# Altium footprint library my_pcb_lib.PcbLib: 26 footprints (part 1 of 2)
Each footprint in its own frame and in the unit in brackets; x right, y up, seen from the top. Pads: shape width x height; smd on the part's side, far side on the other; paste and mask are expansions set on the pad; w line width, h text height; cw(c..) or ccw(c..) is an arc to the next point about the centre after c.
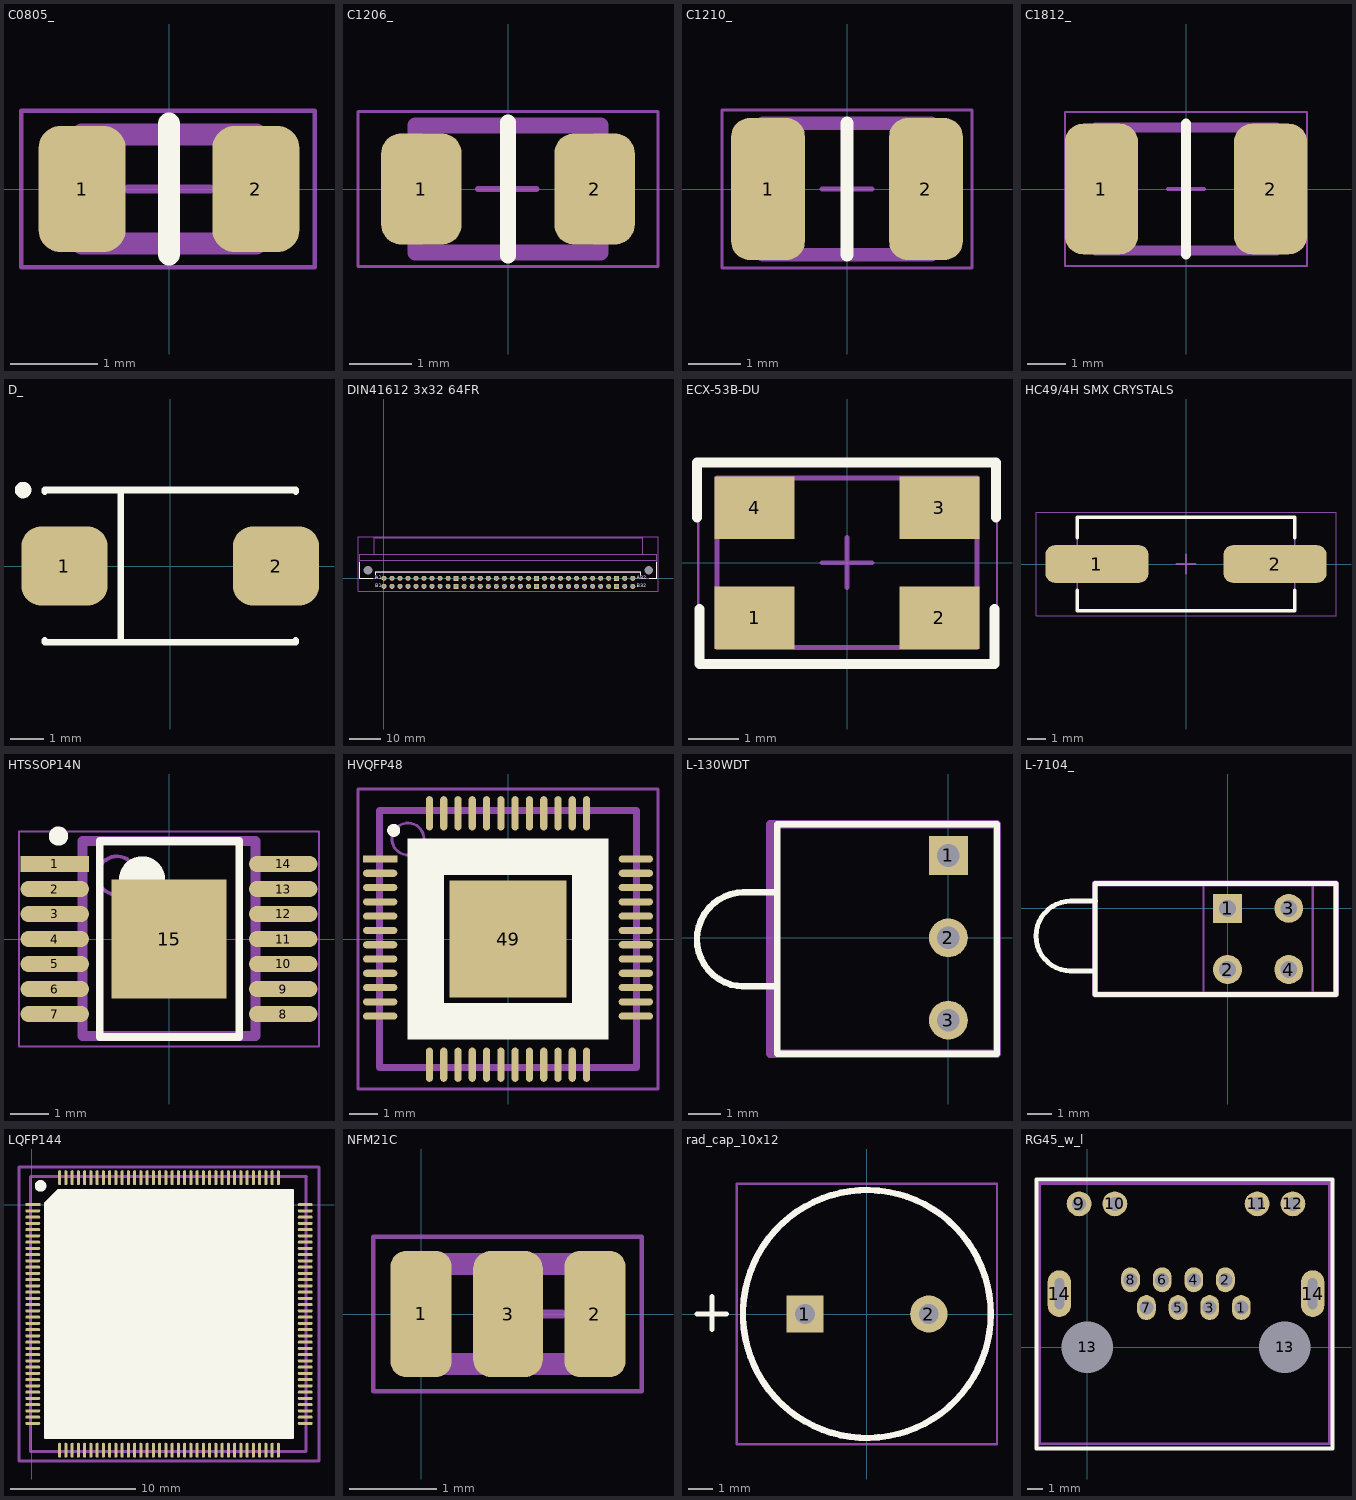
[diagram p0: the footprints below, top view; thin cyan lines are the x and y axes]

## C0805_ [mm]
height 0.025
pads (2):
  rrect50% 1x1.45 smd: 1(-1,0) 2(1,0)
Top Overlay:
  lines w0.254: 0,-0.75 0,0.75
Mechanical 3:
  lines w0.254: -1,-0.625 -1,0.625 1,0.625 1,-0.625 -1,-0.625
Mechanical 13:
  lines w0.1: -1,-0.625 1,-0.625 1,0.625 -1,0.625 -1,-0.625
Mechanical 15:
  lines w0.05: -1.7,-0.9 -1.7,0.9 1.675,0.9 1.675,-0.9 -1.7,-0.9
  lines w0.1: -0.475,0 0.475,0 ; 0,-0.475 0,0.475
3D body "SW3dPS-0805 SMD Capacitor.STEP": height 0.78, standoff 0, extent -1,-0.625 1,0.625

## C1206_ [mm]
height 2
pads (2):
  rrect50% 1.3x1.8 smd: 1(-1.4,0) 2(1.4,0)
Top Overlay:
  lines w0.254: 0,-1.075 0,1.075
Mechanical 3:
  lines w0.254: -1.5,-1.025 1.5,-1.025 1.5,1.025 -1.5,1.025 -1.5,-1.025
Mechanical 13:
  lines w0.1: -1.525,-1.025 1.5,-1.025 1.5,1.025 -1.525,1.025 -1.525,-1.025
Mechanical 15:
  lines w0.05: -2.425,-1.25 2.425,-1.25 2.425,1.25 -2.425,1.25 -2.425,-1.25
  lines w0.1: -0.488,0 0.462,0 ; -0.013,-0.475 -0.013,0.475
3D body "SW3dPS-1206 SMD Capacitor.STEP": height 1, standoff 0, extent -1.6,-0.8 1.6,0.8

## C1210_ [mm]
pads (2):
  rrect50% 1.4x2.7 smd: 1(-1.5,0) 2(1.5,0)
Top Overlay:
  lines w0.254: 0,-1.25 0,1.25
Mechanical 3:
  lines w0.254: -1.6,-1.25 -1.6,1.25 1.6,1.25 1.6,-1.25 -1.6,-1.25
Mechanical 13:
  lines w0.1: -1.6,-1.25 1.6,-1.25 1.6,1.25 -1.6,1.25 -1.6,-1.25
Mechanical 15:
  lines w0.05: -2.375,-1.5 -2.375,1.5 2.375,1.5 2.375,-1.5 -2.375,-1.5
  lines w0.1: -0.475,0 0.475,0 ; 0,-0.475 0,0.475
3D body "c1210c105k1ractu.stp": height 1.94, standoff 0.04, extent -1.651,-1.35 1.749,1.35

## C1812_ [mm]
pads (2):
  rrect50% 1.9x3.4 smd: 1(-2.2,0) 2(2.2,0)
Top Overlay:
  lines w0.254: 0,-1.7 0,1.7
Mechanical 3:
  lines w0.254: -2.35,-1.6 -2.35,1.6 2.35,1.6 2.35,-1.6 -2.35,-1.6
Mechanical 13:
  lines w0.1: -2.35,-1.6 -2.35,1.6 2.35,1.6 2.35,-1.6 -2.35,-1.6
Mechanical 15:
  lines w0.05: -3.15,-2 3.15,-2 3.15,2 -3.15,2 -3.15,-2
  lines w0.1: -0.475,0 0.475,0 ; 0,-0.475 0,0.475
3D body "70611065.stp": height 1.84, standoff 0.04, extent -2.45,-1.778 2.45,1.722

## D_ [mm] "Capacitor, SM Tantalum; Body 7.3 x 4.3 mm (LxW typ)"
height 3.1
pads (2):
  rrect50% 2.6x2.4 smd: 1(-3.2,0) 2(3.2,0)
Top Overlay:
  circle w0.25: c-4.45,2.3 r0.125
  lines w0.2: -3.8,-2.25 -3.8,-2.3 3.8,-2.3 3.8,-2.25 ; -3.8,2.25 -3.8,2.3 3.8,2.3 3.8,2.25 ; -1.5,-2.3 -1.5,2.3
3D body "User Library-CaseD_7343-31.STEP": height 2.8, standoff 0, extent -3.65,-2.15 3.65,2.15

## DIN41612 3x32 64FR [mm] "96-Pin DIN Standard Right Angle Male PCB Mount Connector Розетка"
height 9.5
pads (66):
  round 0 hole 2.8 unplated mask+1.5: 0(-5.08,2.54) 0(83.82,2.54)
  round 1.6 hole 1: A1(0,0) A2(2.54,0) A3(5.08,0) A4(7.62,0) A5(10.16,0) A6(12.7,0) A7(15.24,0) A8(17.78,0) A9(20.32,0) A11(25.4,0) A12(27.94,0) A13(30.48,0) A14(33.02,0) A15(35.56,0) A16(38.1,0) A17(40.64,0) A18(43.18,0) A19(45.72,0) A21(50.8,0) A22(53.34,0) A23(55.88,0) A24(58.42,0) A25(60.96,0) A26(63.5,0) A27(66.04,0) A28(68.58,0) A29(71.12,0) A31(76.2,0) A32(78.74,0) B1(0,-2.54) B2(2.54,-2.54) B3(5.08,-2.54) B4(7.62,-2.54) B5(10.16,-2.54) B6(12.7,-2.54) B7(15.24,-2.54) B8(17.78,-2.54) B9(20.32,-2.54) B11(25.4,-2.54) B12(27.94,-2.54) B13(30.48,-2.54) B14(33.02,-2.54) B15(35.56,-2.54) B16(38.1,-2.54) B17(40.64,-2.54) B18(43.18,-2.54) B19(45.72,-2.54) B21(50.8,-2.54) B22(53.34,-2.54) B23(55.88,-2.54) B24(58.42,-2.54) B25(60.96,-2.54) B26(63.5,-2.54) B27(66.04,-2.54) B28(68.58,-2.54) B29(71.12,-2.54) B31(76.2,-2.54) B32(78.74,-2.54)
  rect 1.6x1.6 hole 1: A10(22.86,0) A20(48.26,0) A30(73.66,0) B10(22.86,-2.54) B20(48.26,-2.54) B30(73.66,-2.54)
Top Overlay:
  lines w0.2: -7.62,5 -7.62,0 -3.6,0 ; -2.54,1.06 -2.54,2 81.28,2 81.28,0.92 ; 84,0 86.36,0 86.36,5
  text "A1" at -2.8,-0.75 h2
  text "B1" at -2.8,-3.3 h2
  text "A32" at 80,-0.75 h2
  text "B32" at 80,-3.3 h2
Bottom Overlay:
  lines w0.2: -7.62,5 -7.62,0 -2.54,0 -2.54,-4.061 81.28,-4.061 81.28,0 86.36,0 86.36,5
Mechanical 3:
  lines w0.254: -7.625,0 -2.525,0 ; -7.62,0.025 -7.62,7.525 ; -7.62,5.7 86.36,5.7 ; -7.605,7.55 -3.125,7.55 ; -3.125,7.575 -3.125,12.75 81.85,12.75 81.85,7.55 86.36,7.55 ; -2.555,1.975 81.25,1.975 ; -2.55,0 -2.55,1.975 ; 81.275,0 81.275,1.95 ; 81.3,0 86.3,0 ; 86.36,0 86.36,7.505
Mechanical 13:
  lines w0.2: -7.62,5.7 86.36,5.7 ; -7.62,7.54 -7.62,0 -2.54,0 -2.54,2 81.28,2 81.28,0 86.36,0 86.36,7.54 81.85,7.54 ; -7.6,7.54 -3.125,7.54 ; -3.125,7.54 81.85,7.54 ; -3.125,7.54 -3.125,12.75 81.85,12.75 81.85,7.54
Mechanical 15:
  lines w0.05: -8.2,-4.028 86.725,-4.028 86.725,13.1 -8.2,13.1 -8.2,-4.028
  lines w0.1: -0.5,0.025 0.5,0.025 ; 0,-0.5 0,0.5
3D body "din_41612_male_b-64abr.stp": height 7.4, standoff -2.9, extent -7.484,-2.845 86.516,12.725

## ECX-53B-DU [mm] "SMX crystals"
height 4.3
pads (4):
  rect 1.6x1.25 smd: 1(-1.85,-1.1) 2(1.85,-1.1) 3(1.85,1.1) 4(-1.85,1.1)
Top Overlay:
  lines w0.2: -3,0.9 -3,2 2.975,2 2.975,0.9 ; -2.95,-0.925 -2.95,-2.025 2.95,-2.025 2.95,-0.925
Mechanical 13:
  lines w0.1: -2.6,-1.7 2.6,-1.7 2.6,1.7 -2.6,1.7 -2.6,-1.7
Mechanical 15:
  lines w0.05: -2.975,-2.05 3,-2.05 3,2 -2.975,2 -2.975,-2.05
  lines w0.1: -0.5,0 0.5,0 ; 0,-0.5 0,0.5
3D body "User Library-XTAL_ecx-53b.step": height 0.85, standoff 0, extent -2.5,-1.6 2.5,1.6

## HC49/4H SMX CRYSTALS [mm] "SMX crystals"
height 4.3
pads (2):
  rrect50% 5.5x2 smd: 1(-4.75,0) 2(4.75,0)
Top Overlay:
  lines w0.2: -5.8,-1.4 -5.8,-2.5 5.8,-2.5 5.8,-1.4 ; -5.8,1.4 -5.8,2.5 5.8,2.5 5.8,1.4
Mechanical 13:
  lines w0.1: -5.8,-2.45 -5.8,2.45 5.8,2.45 5.8,-2.45 -5.8,-2.45
Mechanical 15:
  lines w0.05: -8,-2.75 -8,2.75 8,2.75 8,-2.75 -8,-2.75
  lines w0.1: -0.5,0 0.5,0 ; 0,-0.5 0,0.5
3D body: height 4.3, standoff 0, extent -5.8,-2.45 5.8,2.45

## HTSSOP14N [mm] "TSSOP, 14-Leads, Body 5,00x4,40mm, Pitch 0,65mm, IPC Medium Density"
height 1.05
pads (15):
  rect 1.78x0.42 smd: 1(-2.97,1.95)
  oval 1.78x0.42 smd: 2(-2.97,1.3) 3(-2.97,0.65) 4(-2.97,0) 5(-2.97,-0.65) 6(-2.97,-1.3) 7(-2.97,-1.95) 8(2.97,-1.95) 9(2.97,-1.3) 10(2.97,-0.65) 11(2.97,0) 12(2.97,0.65) 13(2.97,1.3) 14(2.97,1.95)
  rect 3x3.1 smd: 15(0,0)
Top Overlay:
  circle w0.25: c-2.875,2.675 r0.125
  circle w0.6: c-0.7,1.55 r0.3
  lines w0.2: -1.8,-2.55 -1.8,2.55 1.825,2.55 1.825,-2.55 -1.8,-2.55
Mechanical 3:
  lines w0.254: -2.25,-2.525 -2.25,2.55 2.25,2.55 2.25,-2.525 -2.25,-2.525
Mechanical 13:
  circle w0.1: c-1.35,1.65 r0.5
  lines w0.1: -2.25,-2.55 -2.25,2.55 2.25,2.55 2.25,-2.55 -2.25,-2.55
Mechanical 15:
  lines w0.05: -3.9,-2.8 -3.9,2.8 3.9,2.8 3.9,-2.8 -3.9,-2.8
  lines w0.1: -0.5,0 0.5,0 ; 0,-0.5 0,0.5
3D body "User Library-HTSSOP14.STEP": height 1.1, standoff 0, extent -3.191,-2.491 3.191,2.491

## HVQFP48 [mm]
pads (49):
  rect 1.2x0.25 smd: 1(-4.475,2.8)
  oval 1.2x0.25 smd: 2(-4.475,2.3) 3(-4.475,1.8) 4(-4.475,1.3) 5(-4.475,0.8) 6(-4.475,0.3) 7(-4.475,-0.2) 8(-4.475,-0.7) 9(-4.475,-1.2) 10(-4.475,-1.7) 11(-4.475,-2.2) 12(-4.475,-2.7) 25(4.475,-2.7) 26(4.475,-2.2) 27(4.475,-1.7) 28(4.475,-1.2) 29(4.475,-0.7) 30(4.475,-0.2) 31(4.475,0.3) 32(4.475,0.8) 33(4.475,1.3) 34(4.475,1.8) 35(4.475,2.3) 36(4.475,2.8)
  oval 0.25x1.2 smd: 13(-2.75,-4.4) 14(-2.25,-4.4) 15(-1.75,-4.4) 16(-1.25,-4.4) 17(-0.75,-4.4) 18(-0.25,-4.4) 19(0.25,-4.4) 20(0.75,-4.4) 21(1.25,-4.4) 22(1.75,-4.4) 23(2.25,-4.4) 24(2.75,-4.4) 37(2.75,4.4) 38(2.25,4.4) 39(1.75,4.4) 40(1.25,4.4) 41(0.75,4.4) 42(0.25,4.4) 43(-0.25,4.4) 44(-0.75,4.4) 45(-1.25,4.4) 46(-1.75,4.4) 47(-2.25,4.4) 48(-2.75,4.4)
  rect 4.1x4.1 smd: 49(0,0)
Top Overlay:
  region: -3.5,3.5 3.5,3.5 3.5,-3.5 -3.5,-3.5 -3.5,3.5 -2.25,2.25 -2.25,-2.25 2.25,-2.25 2.25,2.25 -2.25,2.25
  lines w0.254: -3.905,3.768 cw(c-4,3.8) -3.9,3.8
Mechanical 11:
  lines w0.254: -4.5,-4.5 -4.5,4.5 4.5,4.5 4.5,-4.5 -4.5,-4.5
Mechanical 13:
  circle w0.1: c-3.5,3.5 r0.559
  lines w0.1: -4.5,-4.461 4.5,-4.461 4.5,4.539 -4.5,4.539 -4.5,-4.461
Mechanical 15:
  lines w0.1: -5.25,-5.25 -5.25,5.25 5.25,5.25 5.25,-5.25 -5.25,-5.25
3D body "User Library-Assem10.step": height 1.56, standoff 0, extent -4.5,-4.461 4.5,4.539

## L-130WDT [mm]
pads (3):
  rect 1.2x1.2 hole 0.7: 1(0,2.54)
  round 1.2 hole 0.7: 2(0,0) 3(0,-2.54)
Top Overlay:
  lines w0.2: -6.35,-1.5 -5.3,-1.5 ; -6.325,1.4 -5.275,1.4 ; -6.3,-1.5 cw(c-6.3,-0.05) -6.3,1.4 ; -5.275,-3.57 1.5,-3.57 1.5,3.5 -5.275,3.5 -5.275,-3.57
Mechanical 3:
  lines w0.254: -5.5,-3.575 1.5,-3.575 1.5,3.5 -5.5,3.5 -5.5,-3.575
Mechanical 13:
  lines w0.1: -5.275,-3.57 -5.275,3.425 1.5,3.425 1.5,-3.57 -5.275,-3.57
Mechanical 15:
  lines w0.1: -0.4,0 0.4,0 ; 0,-0.4 0,0.4 ; -5.425,-3.57 1.5,-3.57 1.5,3.5 -5.425,3.5 -5.425,-3.57
3D body: height 3.86, standoff 0.97, extent -7.78,-1.447 -5.08,1.447
3D body: height 5, standoff 0, extent -5.08,-3.5 1.27,3.5

## L-7104_ [mm]
pads (4):
  rect 1.2x1.2 hole 0.7: 1(0,0)
  round 1.2 hole 0.7: 2(0,-2.54) 3(2.54,0) 4(2.54,-2.54)
Top Overlay:
  lines w0.2: -6.55,-2.6 -5.5,-2.6 ; -6.525,0.3 -5.475,0.3 ; -6.5,-2.6 cw(c-6.5,-1.15) -6.5,0.3 ; -5.5,-3.57 4.5,-3.57 4.5,1.03 -5.5,1.03 -5.5,-3.57
Mechanical 3:
  lines w0.254: -5.5,-3.575 4.5,-3.575 4.5,1.025 -5.5,1.025 -5.5,-3.575
Mechanical 13:
  lines w0.1: -5.5,-3.57 -5.5,1.03 4.5,1.03 4.5,-3.57 -5.5,-3.57
Mechanical 15:
  lines w0.1: -0.4,0 0.4,0 ; 0,-0.4 0,0.4 ; -1,-3.57 3.54,-3.57 3.54,1.03 -1,1.03 -1,-3.57
3D body "User Library-L-7104MD-2GD.step": height 9.65, standoff -3.68, extent -7.23,-3.45 3.7,0.85

## LQFP144 [mm]
pads (144):
  rect 1.2x0.25 smd: 1(0.1,0)
  oval 1.2x0.25 smd: 2(0.1,-0.5) 3(0.1,-1) 4(0.1,-1.5) 5(0.1,-2) 6(0.1,-2.5) 7(0.1,-3) 8(0.1,-3.5) 9(0.1,-4) 10(0.1,-4.5) 11(0.1,-5) 12(0.1,-5.5) 13(0.1,-6) 14(0.1,-6.5) 15(0.1,-7) 16(0.1,-7.5) 17(0.1,-8) 18(0.1,-8.5) 19(0.1,-9) 20(0.1,-9.5) 21(0.1,-10) 22(0.1,-10.5) 23(0.1,-11) 24(0.1,-11.5) 25(0.1,-12) 26(0.1,-12.5) 27(0.1,-13) 28(0.1,-13.5) 29(0.1,-14) 30(0.1,-14.5) 31(0.1,-15) 32(0.1,-15.5) 33(0.1,-16) 34(0.1,-16.5) 35(0.1,-17) 36(0.1,-17.5) 73(21.9,-17.5) 74(21.9,-17) 75(21.9,-16.5) 76(21.9,-16) 77(21.9,-15.5) 78(21.9,-15) 79(21.9,-14.5) 80(21.9,-14) 81(21.9,-13.5) 82(21.9,-13) 83(21.9,-12.5) 84(21.9,-12) 85(21.9,-11.5) 86(21.9,-11) 87(21.9,-10.5) 88(21.9,-10) 89(21.9,-9.5) 90(21.9,-9) 91(21.9,-8.5) 92(21.9,-8) 93(21.9,-7.5) 94(21.9,-7) 95(21.9,-6.5) 96(21.9,-6) 97(21.9,-5.5) 98(21.9,-5) 99(21.9,-4.5) 100(21.9,-4) 101(21.9,-3.5) 102(21.9,-3) 103(21.9,-2.5) 104(21.9,-2) 105(21.9,-1.5) 106(21.9,-1) 107(21.9,-0.5) 108(21.9,0)
  oval 0.25x1.2 smd: 37(2.25,-19.65) 38(2.75,-19.65) 39(3.25,-19.65) 40(3.75,-19.65) 41(4.25,-19.65) 42(4.75,-19.65) 43(5.25,-19.65) 44(5.75,-19.65) 45(6.25,-19.65) 46(6.75,-19.65) 47(7.25,-19.65) 48(7.75,-19.65) 49(8.25,-19.65) 50(8.75,-19.65) 51(9.25,-19.65) 52(9.75,-19.65) 53(10.25,-19.65) 54(10.75,-19.65) 55(11.25,-19.65) 56(11.75,-19.65) 57(12.25,-19.65) 58(12.75,-19.65) 59(13.25,-19.65) 60(13.75,-19.65) 61(14.25,-19.65) 62(14.75,-19.65) 63(15.25,-19.65) 64(15.75,-19.65) 65(16.25,-19.65) 66(16.75,-19.65) 67(17.25,-19.65) 68(17.75,-19.65) 69(18.25,-19.65) 70(18.75,-19.65) 71(19.25,-19.65) 72(19.75,-19.65) 109(19.75,2.15) 110(19.25,2.15) 111(18.75,2.15) 112(18.25,2.15) 113(17.75,2.15) 114(17.25,2.15) 115(16.75,2.15) 116(16.25,2.15) 117(15.75,2.15) 118(15.25,2.15) 119(14.75,2.15) 120(14.25,2.15) 121(13.75,2.15) 122(13.25,2.15) 123(12.75,2.15) 124(12.25,2.15) 125(11.75,2.15) 126(11.25,2.15) 127(10.75,2.15) 128(10.25,2.15) 129(9.75,2.15) 130(9.25,2.15) 131(8.75,2.15) 132(8.25,2.15) 133(7.75,2.15) 134(7.25,2.15) 135(6.75,2.15) 136(6.25,2.15) 137(5.75,2.15) 138(5.25,2.15) 139(4.75,2.15) 140(4.25,2.15) 141(3.75,2.15) 142(3.25,2.15) 143(2.75,2.15) 144(2.25,2.15)
Top Overlay:
  circle w0.5: c0.725,1.5 r0.215
  rectangle: 2.17,-18.665 20.915,1.165
  region: 2.17,1.165 1.085,0.08 1.085,-18.665 2.17,-18.665
  lines w0.2: 1.085,-18.665 20.915,-18.665 20.915,1.165 2.17,1.165 1.085,0.08 1.085,-18.665
Mechanical 3:
  lines w0.254: -0.075,-19.725 -0.075,2.25 21.975,2.25 21.95,2.225 21.95,-19.75 -0.05,-19.75 -0.075,-19.725
Mechanical 11:
  lines w0.254: -1,-20.5 -1,3 23,3 23,-20.5 -1,-20.5
Mechanical 13:
  circle w0.1: c2.5,0 r1.118
  lines w0.1: -0.025,-19.775 -0.025,2.225 21.975,2.225 21.975,-19.775 -0.025,-19.775
3D body "User Library-LQFP144_STM32F4.STEP": height 1.9, standoff 0, extent -0.025,-19.775 21.975,2.225

## NFM21C [mm]
height 0.95
pads (3):
  rrect50% 0.7x1.45 smd: 1(0,0) 2(2,0)
  rrect50% 0.8x1.45 smd: 3(1,0)
Mechanical 3:
  lines w0.254: 0.025,-0.575 0.025,0.575 2.032,0.575 2.032,-0.575 0.025,-0.575
Mechanical 13:
  lines w0.1: 0.15,-0.625 1.905,-0.625 1.905,0.625 0.15,0.625 0.15,-0.625
Mechanical 15:
  lines w0.05: -0.55,-0.889 -0.55,0.889 2.54,0.889 2.54,-0.889 -0.55,-0.889
  lines w0.1: 0.675,0 1.625,0 ; 1.15,-0.475 1.15,0.475
3D body "User Library-Murata_NFM21C.STEP": height 0.85, standoff 0, extent 0.016,-0.625 2.016,0.625

## rad_cap_10х12 [mm]
height 102
pads (2):
  rect 1.5x1.5 hole 0.8: 1(-2.5,0)
  round 1.5 hole 0.8: 2(2.5,0)
Top Overlay:
  circle w0.254: c0,0 r5
  lines w0.2: -6.85,0 -5.65,0 ; -6.25,-0.625 -6.25,0.7
Mechanical 3:
  circle w0.254: c0,0 r5
  text ".Designator" at -3.125,6.5 h1.52
Mechanical 15:
  lines w0.1: -5.25,-5.25 -5.25,5.25 5.25,5.25 5.25,-5.25 -5.25,-5.25
3D body "User Library-Cap electrolitic radial 10x12.STEP": height 12.3, standoff -1.2, extent -4.998,-4.999 4.998,4.998

## RG45_w_l [mm]
pads (16):
  oval 1.2x1.6 hole 0.9: 1(9.9,2.54) 2(8.88,4.32) 3(7.87,2.54) 4(6.85,4.32) 5(5.84,2.54) 6(4.82,4.32) 7(3.81,2.54) 8(2.79,4.32)
  round 1.6 hole 0.9: 9(-0.51,9.2) 10(1.78,9.2) 11(10.92,9.2) 12(13.21,9.2)
  round 1.524 hole 3.3: 13(0,0) 13(12.7,0)
  oval 1.5x3 hole 0.6 slot 2 at 90 deg: 14(-1.78,3.43) 14(14.48,3.43)
Top Overlay:
  lines w0.254: -3.25,-6.5 15.5,-6.5 15.75,-6.5 15.75,10.75 -3.25,10.75 -3.25,-6.5
Mechanical 11:
  lines w0.2: -3.075,-6.225 -3.05,10.5 15.575,10.5 15.575,-6.2 -3.075,-6.225
Mechanical 13:
  lines w0.1: -3.072,-6.223 15.572,-6.223 15.572,10.498 -3.072,10.498 -3.072,-6.223
3D body "16m2834_2-406549-1.stp": height 14.8, standoff -3.92, extent -3.072,-6.223 15.572,10.498